# Altium footprint library Lay-51943_B.brd.PcbLib: 38 footprints (part 2 of 3)
Each footprint in its own frame and in the unit in brackets; x right, y up, seen from the top. Pads: shape width x height; smd on the part's side, far side on the other; paste and mask are expansions set on the pad; w line width, h text height; cw(c..) or ccw(c..) is an arc to the next point about the centre after c.
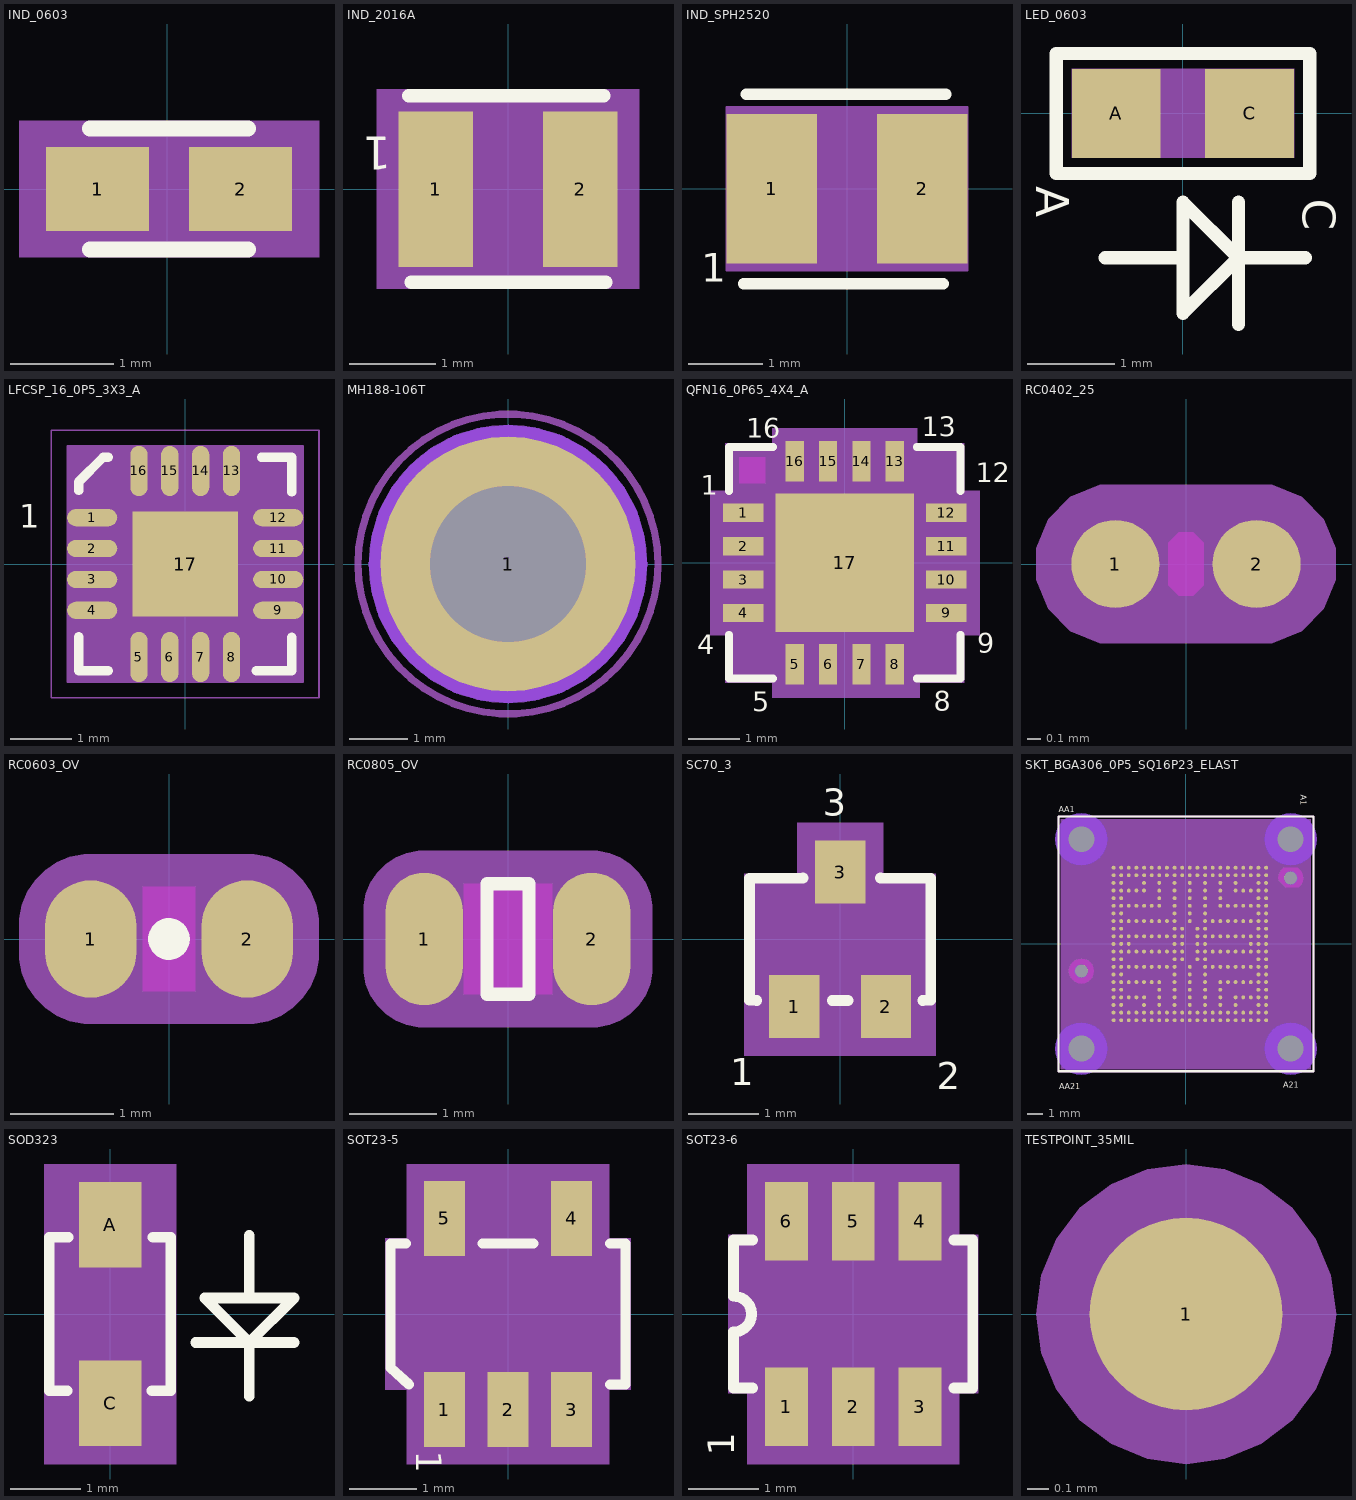
[diagram p1: the footprints below, top view; thin cyan lines are the x and y axes]

## IND_0603 [mil] "IND_0603"
pads (2):
  rect 39x32 smd: 1(-26.56,0) 2(27.78,0)
Top Overlay:
  lines w6: -29.39,-23 30.61,-23 ; -29.39,23 30.61,23
Top Courtyard:
  region: 57.61,-26 57.61,26 -56.39,26 -56.39,-26
Top Assembly:
  lines w1: -44.27,-14.96 30.53,-14.96 30.53,14.96 -29.31,14.96 -29.31,-14.96
Top Value:
  text ".Comment" at -51.17,-7.5 h15
Top Component Center:
  lines w1: -9.39,0 10.61,0 ; 0.61,-10 0.61,10
Top Designator:
  text ".Designator" at -54.7,-5.36 h15
Top Component Outline:
  region: -47.27,-17.96 47.28,-17.96 47.28,17.96 -47.27,17.96
  region: -47.27,-17.96 47.28,-17.96 47.28,17.96 -47.27,17.96
3D body "L_0603.stp": height 31.89, standoff 0.39, extent -30.89,-15.75 32.11,15.75

## IND_2016A [mil] "IND_2016A"
pads (2):
  rect 34x71 smd: 1(-32.87,-0.08) 2(32.87,-0.08)
Top Overlay:
  lines w5.98: -45.24,42.48 43.66,42.48 43.66,42.64 ; -44.29,-42.48 44.61,-42.48 44.61,-42.32
  text "1" at -53.3,23.81 h15
Top Courtyard:
  region: -59.87,-45.43 59.87,-45.43 59.87,45.43 -59.87,45.43
Top Assembly:
  lines w1: -43.31,-35.51 -43.31,35.35 43.31,35.35 43.31,-35.51 -43.31,-35.51
Top Value:
  text ".Comment" at -51.17,-7.5 h15
Top Component Center:
  lines w1: -10,-0.08 10,-0.08 ; 0,-10.08 0,9.92
Top Designator:
  text ".Designator" at -54.7,-5.36 h15
Top Component Outline:
  region: -49.87,-35.43 49.87,-35.43 49.87,35.43 -49.87,35.43
  region: -49.87,-35.43 -49.87,35.43 49.87,35.43 49.87,-35.43
3D body "INDC2012X95N EIA 0805.step": height 37.4, standoff 0, extent -39.37,-23.7 39.37,23.54

## IND_SPH2520 [mil] "IND_SPH2520"
pads (2):
  rect 48x79 smd: 1(-39.75,0) 2(39.75,0)
Top Overlay:
  lines w5.98: -54.65,-50.24 50.87,-50.24 ; -53.23,50 52.28,50
  text "1" at -77.1,-49.06 h15
Top Assembly:
  lines w1: -53.15,-43.31 -53.15,43.31 53.15,43.31 53.15,-43.31 -53.15,-43.31
Top Value:
  lines w1: -63.76,-43.31 63.76,-43.31 63.76,43.31 -63.76,43.31 -63.76,-43.31
  text ".Comment" at -51.17,-7.5 h15
Top Component Center:
  lines w1: -10,0 10,0 ; 0,-10 0,10
Top Designator:
  text ".Designator" at -54.7,-5.36 h15
Top Component Outline:
  region: 63.76,43.31 63.76,-43.31 -63.76,-43.31 -63.76,43.31
3D body "INDC2520X220N EIA 1008.step": height 86.61, standoff 0, extent -49.21,-39.37 49.21,39.37

## LED_0603 [mil] "LED_0603"
pads (2):
  rect 40x40 smd: A(-30,0) C(30,0)
Top Overlay:
  lines w6: -57,27 -57,-27 57,-27 57,27 -56.5,27 ; -35,-65 0,-65 ; 25,-95 25,-40 ; 55,-65 25,-65 ; 25,-65 0,-90 0,-40 25,-65
  text "C" at 53.87,-38.33 h15
  text "A" at -66.12,-32.84 h15
Top Assembly:
  lines w1: -35,-65 0,-65 ; 25,-95 25,-40 ; 55,-65 25,-65 ; 25,-65 0,-90 0,-40 25,-65 ; -33.46,-17.72 -33.46,17.72 33.46,17.72 33.46,-17.72 -33.46,-17.72
Top Value:
  text ".Comment" at -51.17,-7.5 h15
Top Component Center:
  lines w1: -10,0 10,0 ; 0,-10 0,10
Top Designator:
  text ".Designator" at -54.7,-5.36 h15
Top Component Outline:
  region: -50,-20 50,-20 50,20 -50,20
  region: -50,-20 50,-20 50,20 -50,20
3D body "LTST-C190GKT.STEP": height 35.43, standoff 0, extent -33.46,-17.72 33.46,17.72

## LFCSP_16_0P5_3X3_A [mil] "LFCSP_16_0P5_3X3_A"
pads (17):
  oval 32x11 smd: 1(-59.31,29.53) 2(-59.31,9.84) 3(-59.31,-9.84) 4(-59.31,-29.53) 9(59.31,-29.53) 10(59.31,-9.84) 11(59.31,9.84) 12(59.31,29.53)
  oval 11x32 smd: 5(-29.53,-59.31) 6(-9.84,-59.31) 7(9.84,-59.31) 8(29.53,-59.31) 13(29.53,59.31) 14(9.84,59.31) 15(-9.84,59.31) 16(-29.53,59.31)
  rect 67x67 smd paste-99999: 17(0,0)
Top Overlay:
  lines w6: -68.02,-46.48 -68.02,-68.02 -49.11,-68.02 ; -68.02,46.87 -68.02,52.28 -52.28,68.02 -49.12,68.02 ; 45.3,-68.02 68.02,-68.02 68.02,-46.82 ; 48.64,68.02 68.02,68.02 68.02,45.9
  text "1" at -106,23 h15
Top Paste:
  region: -3.5,3.5 -3.5,31.5 -28,31.5 -28,3.5
  region: 28,3.5 28,31.5 3.5,31.5 3.5,3.5
  region: 28,-31.5 28,-3.5 3.5,-3.5 3.5,-31.5
  region: -3.5,-31.5 -3.5,-3.5 -28,-3.5 -28,-31.5
Top Courtyard:
  lines w1: -85.31,-85.31 85.31,-85.31 85.31,85.31 -85.31,85.31 -85.31,-85.31
Top Assembly:
  lines w1: -61.02,-61.02 -61.02,45.28 -45.28,61.02 61.02,61.02 61.02,-61.02 -61.02,-61.02
Top Value:
  lines w1: -75.31,-75.31 75.31,-75.31 75.31,75.31 -75.31,75.31 -75.31,-75.31
  text ".Comment" at -51.17,-7.5 h15
Top Component Center:
  lines w1: -10,0 10,0 ; 0,-10 0,10
Top Designator:
  text ".Designator" at -54.7,-5.36 h15
Top Component Outline:
  region: -75.31,-75.31 75.31,-75.31 75.31,75.31 -75.31,75.31
3D body "QFN16 3x3.STEP": height 35.43, standoff 0, extent -61,-59.88 58.77,59.88

## MH188-106T [mil] "MH188-106T"
pads (1):
  round 173.23 / inner round 156 / far side round 173.23 hole 106: 1(0,0)
Bottom Layer keep-out:
  region: 94.45,0 92.64,18.43 87.26,36.15 78.54,52.48 66.79,66.79 52.48,78.54 36.15,87.26 18.43,92.64 0,94.45 -18.43,92.64 -36.15,87.26 -47.03,81.45 -52.48,78.54 -66.79,66.79 -78.54,52.48 -87.26,36.15 -92.64,18.43 -94.45,0 -92.64,-18.43 -87.26,-36.15 -78.54,-52.48 -66.79,-66.79 -52.48,-78.54 -47.03,-81.45 -36.15,-87.26 -18.43,-92.64 0,-94.45 18.43,-92.64 36.15,-87.26 52.48,-78.54 66.79,-66.79 78.54,-52.48 87.26,-36.15 92.64,-18.43
Top Courtyard:
  circle w5: c0,0 r101.83
Top Assembly:
  circle w0.01: c0,0 r94
Top Value:
  text ".Comment" at -51.17,-7.5 h15
Top Component Center:
  lines w1: -10,0 10,0 ; 0,-10 0,10
Top Designator:
  text ".Designator" at -54.7,-5.36 h15
Top Component Outline:
  circle w5: c0,0 r92
  region: 94.45,0 92.64,18.43 87.26,36.15 78.54,52.48 66.79,66.79 52.48,78.54 36.15,87.26 18.43,92.64 0,94.45 -18.43,92.64 -36.15,87.26 -47.03,81.45 -52.48,78.54 -66.79,66.79 -78.54,52.48 -87.26,36.15 -92.64,18.43 -94.45,0 -92.64,-18.43 -87.26,-36.15 -78.54,-52.48 -66.79,-66.79 -52.48,-78.54 -47.03,-81.45 -36.15,-87.26 -18.43,-92.64 0,-94.45 18.43,-92.64 36.15,-87.26 52.48,-78.54 66.79,-66.79 78.54,-52.48 87.26,-36.15 92.64,-18.43

## QFN16_0P65_4X4_A [mil] "QFN16_0P65_4X4_A"
pads (17):
  rect 31x14 smd paste+0: 1(-77.76,38.38) 2(-77.76,12.79) 3(-77.76,-12.81) 4(-77.76,-38.4) 9(77.76,-38.4) 10(77.76,-12.81) 11(77.76,12.79) 12(77.76,38.38)
  rect 14x31 smd paste+0: 5(-38.39,-77.77) 6(-12.8,-77.77) 7(12.8,-77.77) 8(38.39,-77.77) 13(38.39,77.75) 14(12.8,77.75) 15(-12.8,77.75) 16(-38.39,77.75)
  rect 106x106 smd paste-99999: 17(0,-0.01)
Top Layer keep-out:
  region: -80.82,61.12 -80.82,80.81 -61.13,80.81 -61.13,61.12
  region: -80.82,61.12 -61.13,61.12 -61.13,80.81 -80.82,80.81
Top Overlay:
  lines w6: -88.69,-55.13 -88.69,-88.7 -55.12,-88.7 ; -88.69,55.11 -88.69,88.68 -55.12,88.68 ; 55.12,-88.7 88.69,-88.7 88.69,-55.13 ; 55.12,88.68 88.69,88.68 88.69,55.11
  text "1" at -110.2,52.23 h15
  text "4" at -113.24,-69.92 h15
  text "5" at -70.73,-113.82 h15
  text "8" at 68.24,-113.36 h15
  text "9" at 101.64,-68.98 h15
  text "12" at 100.24,61.81 h15
  text "13" at 59.13,97.08 h15
  text "16" at -75.4,95.68 h15
Top Paste:
  region: 7.78,7.77 7.78,45.35 45.36,45.35 45.36,7.77
  region: 7.78,-45.37 7.78,-7.79 45.36,-7.79 45.36,-45.37
  region: -45.36,7.77 -45.36,45.35 -7.78,45.35 -7.78,7.77
  region: -45.36,-45.37 -45.36,-7.79 -7.78,-7.79 -7.78,-45.37
Top Courtyard:
  region: -55.39,-91.71 -91.7,-91.71 -91.7,-55.4 -103.26,-55.4 -103.26,55.36 -91.7,55.36 -91.7,91.67 -55.39,91.67 -55.39,103.25 55.38,103.25 55.38,91.67 91.69,91.67 91.69,55.36 103.25,55.36 103.25,-55.4 91.69,-55.4 91.69,-91.71 57.38,-91.71 57.38,-103.28 -55.39,-103.28
Top Assembly:
  lines w1: -81.69,-81.7 81.69,-81.7 81.69,81.68 -81.69,81.68 -81.69,-81.7
  text "16" at -46.39,72.75 h10
  text "13" at 30.39,72.75 h10
  text "12" at 69.76,33.38 h10
  text "9" at 73.76,-43.4 h10
  text "8" at 34.39,-82.77 h10
  text "5" at -42.39,-82.77 h10
  text "4" at -81.76,-43.4 h10
  text "1" at -81.76,33.38 h10
Top Value:
  text ".Comment" at -51.17,-7.5 h15
Top Component Center:
  lines w1: -10,-0.01 10,-0.01 ; 0,-10.01 0,9.99
Top Designator:
  text ".Designator" at -54.7,-5.36 h15
Top Component Outline:
  region: -45.39,-93.27 -45.39,-81.7 -81.69,-81.7 -81.69,-45.39 -93.25,-45.39 -93.25,45.37 -81.69,45.37 -81.69,81.68 -45.39,81.68 -45.39,93.27 45.39,93.27 45.39,81.68 81.69,81.68 81.69,45.38 93.26,45.38 93.26,-45.39 81.69,-45.39 81.69,-81.7 47.39,-81.7 47.39,-93.27
  region: -45.39,-93.27 -45.39,-81.7 -81.69,-81.7 -81.69,-45.39 -93.25,-45.39 -93.25,45.37 -81.69,45.37 -81.69,81.68 -45.39,81.68 -45.39,93.27 45.39,93.27 45.39,81.68 81.69,81.68 81.69,45.38 93.26,45.38 93.26,-45.39 81.69,-45.39 81.69,-81.7 47.39,-81.7 47.39,-93.27
3D body "QFN16 4x4.step": height 36.22, standoff 0, extent -78.74,-78.74 78.74,78.74

## RC0402_25 [mil] "RC0402_25"
pads (2):
  round 25 smd: 1(-20,0) 2(20,0)
Top Layer keep-out:
  region: 5,4 5,-4 5,-6.07 2.07,-9 -2.07,-9 -5,-6.07 -5,-4 -5,4 -5,6.07 -2.07,9 2.07,9 5,6.07
Top Courtyard:
  region: -20,-22.5 -24.48,-22.5 -32.75,-19.07 -39.07,-12.75 -42.5,-4.48 -42.5,4.48 -39.07,12.75 -32.75,19.07 -24.48,22.5 -20,22.5 20,22.5 24.48,22.5 32.75,19.07 39.07,12.75 42.5,4.48 42.5,-4.48 39.07,-12.75 32.75,-19.07 24.48,-22.5 20,-22.5
Top Assembly:
  lines w1: -20,-10 -20,10 20,10 20,-10 -20,-10
Top Value:
  text ".Comment" at -51.17,-7.5 h15
Top Component Center:
  lines w1: -10,0 10,0 ; 0,-10 0,10
Top Designator:
  text ".Designator" at -54.7,-5.36 h15
Top Component Outline:
  region: 20,-12.5 22.49,-12.5 27.08,-10.6 30.6,-7.08 32.5,-2.49 32.5,2.49 30.6,7.08 27.08,10.6 22.49,12.5 20,12.5 -20,12.5 -22.49,12.5 -27.08,10.6 -30.6,7.08 -32.5,2.49 -32.5,-2.49 -30.6,-7.08 -27.08,-10.6 -22.49,-12.5 -20,-12.5
  region: 20,-12.5 22.49,-12.5 27.08,-10.6 30.6,-7.08 32.5,-2.49 32.5,2.49 30.6,7.08 27.08,10.6 22.49,12.5 20,12.5 -20,12.5 -22.49,12.5 -27.08,10.6 -30.6,7.08 -32.5,2.49 -32.5,-2.49 -30.6,-7.08 -27.08,-10.6 -22.49,-12.5 -20,-12.5
3D body "RES_1005-0402.step": height 16.14, standoff 0, extent -22.64,-10.83 22.64,10.83

## RC0603_OV [mil] "RC0603_OV"
pads (2):
  oval 35x45 smd: 1(-30,0) 2(30,0)
Top Layer keep-out:
  region: -10,20 10,20 10,-20 -10,-20
Top Overlay:
  circle w6: c0,0 r5
  dashed: 0,3.03 -2.11,2.15 -2.99,0.04 -2.41,-1.35 -2.11,-2.07 0,-2.95 2.11,-2.07 2.41,-1.35 2.99,0.04 2.11,2.15
Top Courtyard:
  region: -30,-32.5 -32.71,-32.5 -38.02,-31.44 -43.03,-29.37 -47.53,-26.36 -51.36,-22.53 -54.37,-18.03 -56.44,-13.02 -57.5,-7.71 -57.5,-5 -57.5,5 -57.5,7.71 -56.44,13.02 -54.37,18.03 -51.36,22.53 -47.53,26.36 -43.03,29.37 -38.02,31.44 -32.71,32.5 -30,32.5 30,32.5 32.71,32.5 38.02,31.44 43.03,29.37 47.53,26.36 51.36,22.53 54.37,18.03 56.44,13.02 57.5,7.71 57.5,5 57.5,-5 57.5,-7.71 56.44,-13.02 54.37,-18.03 51.36,-22.53 47.53,-26.36 43.03,-29.37 38.02,-31.44 32.71,-32.5 30,-32.5
Top Assembly:
  lines w1: -30,-15 -30,15 30,15 30,-15 -30,-15
Top Value:
  text ".Comment" at -51.17,-7.5 h15
Top Component Center:
  lines w1: -10,0 10,0 ; 0,-10 0,10
Top Designator:
  text ".Designator" at -54.7,-5.36 h15
Top Component Outline:
  region: -30,22.5 30,22.5 33.48,22.5 39.91,19.84 44.84,14.91 47.5,8.48 47.5,5 47.5,-5 47.5,-8.48 44.84,-14.91 39.91,-19.84 33.48,-22.5 30,-22.5 -30,-22.5 -33.48,-22.5 -39.91,-19.84 -44.84,-14.91 -47.5,-8.48 -47.5,-5 -47.5,5 -47.5,8.48 -44.84,14.91 -39.91,19.84 -33.48,22.5
  region: -30,22.5 30,22.5 33.48,22.5 39.91,19.84 44.84,14.91 47.5,8.48 47.5,5 47.5,-5 47.5,-8.48 44.84,-14.91 39.91,-19.84 33.48,-22.5 30,-22.5 -30,-22.5 -33.48,-22.5 -39.91,-19.84 -44.84,-14.91 -47.5,-8.48 -47.5,-5 -47.5,5 -47.5,8.48 -44.84,14.91 -39.91,19.84 -33.48,22.5
3D body "RES_1609-0603.step": height 22.05, standoff 0, extent -33.46,-15.75 33.46,15.75

## RC0805_OV [mil] "RC0805_OV"
pads (2):
  oval 35x60 smd: 1(-38,0) 2(38,0)
Top Layer keep-out:
  region: -20,25 20,25 20,-25 -20,-25
Top Overlay:
  lines w6: -9.5,-25 -9.5,25 9.5,25 9.5,-25 -9.5,-25
Top Courtyard:
  region: -38,-40 -40.71,-40 -46.02,-38.94 -51.03,-36.87 -55.53,-33.86 -59.36,-30.03 -62.37,-25.53 -64.44,-20.52 -65.5,-15.21 -65.5,-12.5 -65.5,12.5 -65.5,15.21 -64.44,20.52 -62.37,25.53 -59.36,30.03 -55.53,33.86 -51.03,36.87 -46.02,38.94 -40.71,40 -38,40 38,40 40.71,40 46.02,38.94 51.03,36.87 55.53,33.86 59.36,30.03 62.37,25.53 64.44,20.52 65.5,15.21 65.5,12.5 65.5,-12.5 65.5,-15.21 64.44,-20.52 62.37,-25.53 59.36,-30.03 55.53,-33.86 51.03,-36.87 46.02,-38.94 40.71,-40 38,-40
Top Assembly:
  lines w1: -40,-25 -40,25 40,25 40,-25 -40,-25
Top Value:
  text ".Comment" at -51.17,-7.5 h15
Top Component Center:
  lines w1: -10,0 10,0 ; 0,-10 0,10
Top Designator:
  text ".Designator" at -54.7,-5.36 h15
Top Component Outline:
  region: -38,-30 38,-30 41.48,-30 47.91,-27.34 52.84,-22.41 55.5,-15.98 55.5,-12.5 55.5,12.5 55.5,15.98 52.84,22.41 47.91,27.34 41.48,30 38,30 -38,30 -41.48,30 -47.91,27.34 -52.84,22.41 -55.5,15.98 -55.5,12.5 -55.5,-12.5 -55.5,-15.98 -52.84,-22.41 -47.91,-27.34 -41.48,-30
  region: -38,-30 38,-30 41.48,-30 47.91,-27.34 52.84,-22.41 55.5,-15.98 55.5,-12.5 55.5,12.5 55.5,15.98 52.84,22.41 47.91,27.34 41.48,30 38,30 -38,30 -41.48,30 -47.91,27.34 -52.84,22.41 -55.5,15.98 -55.5,12.5 -55.5,-12.5 -55.5,-15.98 -52.84,-22.41 -47.91,-27.34 -41.48,-30
3D body "RES_2013-0805.step": height 29.92, standoff 0, extent -45.28,-26.57 45.28,26.57

## SC70_3 [mil] "SC70_3"
pads (3):
  rect 28x35 smd: 1(-25.5,-37.47) 2(25.5,-37.47) 3(0,37.47)
Top Overlay:
  lines w6: -46.42,-34.06 -50.5,-34 -50.5,34 -20.67,34.06 ; -4.37,-34.06 4.33,-34.06 ; 22.48,34.06 50.5,34 50.5,-34 45.98,-34.06
  text "1" at -61.22,-81.38 h15
  text "2" at 53.89,-83.37 h15
  text "3" at -9.69,68.7 h15
Top Courtyard:
  region: -53.3,36.61 -24,36.61 -24,64.97 24,64.97 24,36.61 53.3,36.61 53.3,-64.97 -53.3,-64.97
Top Assembly:
  lines w1: -5,0 5,0 ; 0,-5 0,5 ; -43.3,-26.61 43.3,-26.61 43.3,26.61 -43.3,26.61 -43.3,-26.61
Top Value:
  text ".Comment" at -51.17,-7.5 h15
Top Component Center:
  lines w1: -10,0 10,0 ; 0,-10 0,10
Top Designator:
  text ".Designator" at -54.7,-5.36 h15
Top Component Outline:
  region: -43.3,-54.97 43.3,-54.97 43.3,26.61 14,26.61 14,54.97 -14,54.97 -14,26.61 -43.3,26.61
  region: -43.3,-54.97 43.3,-54.97 43.3,26.61 14,26.61 14,54.97 -14,54.97 -14,26.61 -43.3,26.61
3D body "SOT323_sc70-3.step": height 39.37, standoff 0, extent -41.34,-45.28 41.34,45.28

## SKT_BGA306_0P5_SQ16P23_ELAST [mil] "SKT_BGA306_0P5_SQ16P23_ELAST"
pads (312):
  round 10 smd: A1(206.69,196.85) A2(206.69,177.17) A3(206.69,157.48) A4(206.69,137.8) A5(206.69,118.11) A6(206.69,98.43) A7(206.69,78.74) A8(206.69,59.06) A9(206.69,39.37) A10(206.69,19.69) A11(206.69,0) A12(206.69,-19.69) A13(206.69,-39.37) A14(206.69,-59.06) A15(206.69,-78.74) A16(206.69,-98.43) A17(206.69,-118.11) A18(206.69,-137.8) A19(206.69,-157.48) A20(206.69,-177.17) A21(206.69,-196.85) AA1(-187.01,196.85) AA2(-187.01,177.17) AA3(-187.01,157.48) AA4(-187.01,137.8) AA5(-187.01,118.11) AA6(-187.01,98.43) AA7(-187.01,78.74) AA8(-187.01,59.06) AA9(-187.01,39.37) AA10(-187.01,19.69) AA11(-187.01,0) AA12(-187.01,-19.69) AA13(-187.01,-39.37) AA14(-187.01,-59.06) AA15(-187.01,-78.74) AA16(-187.01,-98.43) AA17(-187.01,-118.11) AA18(-187.01,-137.8) AA19(-187.01,-157.48) AA20(-187.01,-177.17) AA21(-187.01,-196.85) B1(187.01,196.85) B2(187.01,177.17) B3(187.01,157.48) B4(187.01,137.8) B5(187.01,118.11) B6(187.01,98.43) B7(187.01,78.74) B8(187.01,59.06) B9(187.01,39.37) B10(187.01,19.69) B11(187.01,0) B12(187.01,-19.69) B13(187.01,-39.37) B14(187.01,-59.06) B15(187.01,-78.74) B16(187.01,-98.43) B17(187.01,-118.11) B18(187.01,-137.8) B19(187.01,-157.48) B20(187.01,-177.17) B21(187.01,-196.85) C1(167.32,196.85) C2(167.32,177.17) C4(167.32,137.8) C6(167.32,98.43) C8(167.32,59.06) C10(167.32,19.69) C11(167.32,0) C12(167.32,-19.69) C14(167.32,-59.06) C16(167.32,-98.43) C18(167.32,-137.8) C20(167.32,-177.17) C21(167.32,-196.85) D1(147.64,196.85) D2(147.64,177.17) D4(147.64,137.8) D6(147.64,98.43) D8(147.64,59.06) D10(147.64,19.69) D12(147.64,-19.69) D14(147.64,-59.06) D16(147.64,-98.43) D18(147.64,-137.8) D20(147.64,-177.17) D21(147.64,-196.85) E1(127.95,196.85) E2(127.95,177.17) E3(127.95,157.48) E4(127.95,137.8) E6(127.95,98.43) E8(127.95,59.06) E10(127.95,19.69) E12(127.95,-19.69) E14(127.95,-59.06) E16(127.95,-98.43) E18(127.95,-137.8) E19(127.95,-157.48) E20(127.95,-177.17) E21(127.95,-196.85) F1(108.27,196.85) F2(108.27,177.17) F6(108.27,98.43) F8(108.27,59.06) F10(108.27,19.69) F12(108.27,-19.69) F14(108.27,-59.06) F16(108.27,-98.43) F20(108.27,-177.17) F21(108.27,-196.85) G1(88.58,196.85) G2(88.58,177.17) G3(88.58,157.48) G4(88.58,137.8) G5(88.58,118.11) G6(88.58,98.43) G8(88.58,59.06) G10(88.58,19.69) G12(88.58,-19.69) G14(88.58,-59.06) G16(88.58,-98.43) G17(88.58,-118.11) G18(88.58,-137.8) G19(88.58,-157.48) G20(88.58,-177.17) G21(88.58,-196.85) H1(68.9,196.85) H2(68.9,177.17) H8(68.9,59.06) H10(68.9,19.69) H12(68.9,-19.69) H14(68.9,-59.06) H20(68.9,-177.17) H21(68.9,-196.85) J1(49.21,196.85) J2(49.21,177.17) J3(49.21,157.48) J4(49.21,137.8) J5(49.21,118.11) J6(49.21,98.43) J7(49.21,78.74) J8(49.21,59.06) J9(49.21,39.37) J10(49.21,19.69) J11(49.21,0) J12(49.21,-19.69) J13(49.21,-39.37) J14(49.21,-59.06) J15(49.21,-78.74) J16(49.21,-98.43) J17(49.21,-118.11) J18(49.21,-137.8) J19(49.21,-157.48) J20(49.21,-177.17) J21(49.21,-196.85) K1(29.53,196.85) K2(29.53,177.17) K9(29.53,39.37) K10(29.53,19.69) K11(29.53,0) K12(29.53,-19.69) K13(29.53,-39.37) K20(29.53,-177.17) K21(29.53,-196.85) L1(9.84,196.85) L2(9.84,177.17) L3(9.84,157.48) L4(9.84,137.8) L5(9.84,118.11) L6(9.84,98.43) L7(9.84,78.74) L8(9.84,59.06) L14(9.84,-59.06) L15(9.84,-78.74) L16(9.84,-98.43) L17(9.84,-118.11) L18(9.84,-137.8) L19(9.84,-157.48) L20(9.84,-177.17) L21(9.84,-196.85) M1(-9.84,196.85) M2(-9.84,177.17) M9(-9.84,39.37) M10(-9.84,19.69) M11(-9.84,0) M12(-9.84,-19.69) M13(-9.84,-39.37) M20(-9.84,-177.17) M21(-9.84,-196.85) N1(-29.53,196.85) N2(-29.53,177.17) N3(-29.53,157.48) N4(-29.53,137.8) N5(-29.53,118.11) N6(-29.53,98.43) N7(-29.53,78.74) N8(-29.53,59.06) N9(-29.53,39.37) N10(-29.53,19.69) N11(-29.53,0) N12(-29.53,-19.69) N13(-29.53,-39.37) N14(-29.53,-59.06) N15(-29.53,-78.74) N16(-29.53,-98.43) N17(-29.53,-118.11) N18(-29.53,-137.8) N19(-29.53,-157.48) N20(-29.53,-177.17) N21(-29.53,-196.85) P1(-49.21,196.85) P2(-49.21,177.17) P8(-49.21,59.06) P10(-49.21,19.69) P12(-49.21,-19.69) P14(-49.21,-59.06) P20(-49.21,-177.17) P21(-49.21,-196.85) R1(-68.9,196.85) R2(-68.9,177.17) R3(-68.9,157.48) R4(-68.9,137.8) R5(-68.9,118.11) R6(-68.9,98.43) R8(-68.9,59.06) R10(-68.9,19.69) R12(-68.9,-19.69) R14(-68.9,-59.06) R16(-68.9,-98.43) R17(-68.9,-118.11) R18(-68.9,-137.8) R19(-68.9,-157.48) R20(-68.9,-177.17) R21(-68.9,-196.85) T1(-88.58,196.85) T2(-88.58,177.17) T6(-88.58,98.43) T8(-88.58,59.06) T10(-88.58,19.69) T12(-88.58,-19.69) T14(-88.58,-59.06) T16(-88.58,-98.43) T20(-88.58,-177.17) T21(-88.58,-196.85) U1(-108.27,196.85) U2(-108.27,177.17) U3(-108.27,157.48) U4(-108.27,137.8) U6(-108.27,98.43) U8(-108.27,59.06) U10(-108.27,19.69) U12(-108.27,-19.69) U14(-108.27,-59.06) U16(-108.27,-98.43) U18(-108.27,-137.8) U19(-108.27,-157.48) U20(-108.27,-177.17) U21(-108.27,-196.85) V1(-127.95,196.85) V2(-127.95,177.17) V4(-127.95,137.8) V6(-127.95,98.43) V8(-127.95,59.06) V10(-127.95,19.69) V12(-127.95,-19.69) V14(-127.95,-59.06) V16(-127.95,-98.43) V18(-127.95,-137.8) V20(-127.95,-177.17) V21(-127.95,-196.85) W1(-147.64,196.85) W2(-147.64,177.17) W4(-147.64,137.8) W6(-147.64,98.43) W8(-147.64,59.06) W10(-147.64,19.69) W11(-147.64,0) W12(-147.64,-19.69) W14(-147.64,-59.06) W16(-147.64,-98.43) W18(-147.64,-137.8) W20(-147.64,-177.17) W21(-147.64,-196.85) Y1(-167.32,196.85) Y2(-167.32,177.17) Y3(-167.32,157.48) Y4(-167.32,137.8) Y5(-167.32,118.11) Y6(-167.32,98.43) Y7(-167.32,78.74) Y8(-167.32,59.06) Y9(-167.32,39.37) Y10(-167.32,19.69) Y11(-167.32,0) Y12(-167.32,-19.69) Y13(-167.32,-39.37) Y14(-167.32,-59.06) Y15(-167.32,-78.74) Y16(-167.32,-98.43) Y17(-167.32,-118.11) Y18(-167.32,-137.8) Y19(-167.32,-157.48) Y20(-167.32,-177.17) Y21(-167.32,-196.85)
  round 0 hole 66.9 unplated: ""(-270.18,-270.2) ""(-270.18,270.2) ""(270.18,-270.2) ""(270.18,270.2)
  round 0 hole 33.4 unplated: ""(-270.18,-70.18) ""(270.18,170.18)
Bottom Layer keep-out:
  region: 270.18,153.11 276.71,154.41 282.24,158.11 285.94,163.65 287.24,170.18 285.94,176.71 284.7,178.56 282.24,182.24 276.71,185.94 270.18,187.24 263.65,185.94 258.11,182.24 255.65,178.56 254.41,176.71 253.11,170.18 254.41,163.65 258.11,158.11 263.65,154.41
  region: -270.18,-87.24 -263.65,-85.94 -258.11,-82.24 -254.42,-76.71 -253.12,-70.18 -254.42,-63.65 -255.66,-61.79 -258.11,-58.11 -263.65,-54.42 -270.18,-53.12 -276.71,-54.42 -282.24,-58.11 -284.7,-61.79 -285.94,-63.65 -287.24,-70.18 -285.94,-76.71 -282.24,-82.24 -276.71,-85.94
  region: -270.18,-303.95 -261.44,-302.8 -253.3,-299.43 -246.31,-294.06 -240.95,-287.07 -237.58,-278.93 -236.43,-270.2 -237.58,-261.46 -240.95,-253.32 -246.31,-246.33 -253.3,-240.97 -261.44,-237.59 -270.18,-236.44 -278.91,-237.59 -287.05,-240.97 -294.04,-246.33 -299.41,-253.32 -302.78,-261.46 -303.93,-270.2 -302.78,-278.93 -299.41,-287.07 -294.04,-294.06 -287.05,-299.43 -278.91,-302.8
  region: -270.18,-337.44 -257.06,-336.15 -244.44,-332.32 -232.82,-326.11 -222.63,-317.75 -214.26,-307.56 -208.05,-295.93 -204.22,-283.32 -202.93,-270.2 -204.22,-257.08 -208.05,-244.46 -212.19,-236.72 -214.26,-232.84 -222.63,-222.65 -232.82,-214.28 -244.44,-208.07 -257.06,-204.24 -270.18,-202.95 -283.3,-204.24 -295.91,-208.07 -307.54,-214.28 -317.73,-222.65 -326.09,-232.84 -328.17,-236.72 -332.31,-244.46 -336.13,-257.08 -337.42,-270.2 -336.13,-283.32 -332.31,-295.93 -326.09,-307.56 -317.73,-317.75 -307.54,-326.11 -295.91,-332.32 -283.3,-336.15
  region: 270.18,-303.95 278.91,-302.8 287.05,-299.43 294.04,-294.06 299.41,-287.07 302.78,-278.93 303.93,-270.2 302.78,-261.46 299.41,-253.32 294.04,-246.33 287.05,-240.97 278.91,-237.59 270.18,-236.44 261.44,-237.59 253.3,-240.97 246.31,-246.33 240.95,-253.32 237.58,-261.46 236.43,-270.2 237.58,-278.93 240.95,-287.07 246.31,-294.06 253.3,-299.43 261.44,-302.8
  region: 270.18,-337.45 283.3,-336.16 295.92,-332.33 307.54,-326.12 317.74,-317.75 326.1,-307.56 332.31,-295.94 336.14,-283.32 337.43,-270.2 336.14,-257.08 332.31,-244.46 328.17,-236.71 326.1,-232.83 317.74,-222.64 307.54,-214.27 295.92,-208.06 283.3,-204.23 270.18,-202.94 257.06,-204.23 244.44,-208.06 232.81,-214.27 222.62,-222.64 214.25,-232.83 212.18,-236.71 208.04,-244.46 204.21,-257.08 202.92,-270.2 204.21,-283.32 208.04,-295.94 214.25,-307.56 222.62,-317.75 232.81,-326.12 244.44,-332.33 257.06,-336.16
  region: 270.18,236.44 278.91,237.59 287.06,240.96 294.05,246.33 299.41,253.32 302.78,261.46 303.93,270.2 302.78,278.93 299.41,287.07 294.05,294.07 287.06,299.43 278.91,302.8 270.18,303.95 261.44,302.8 253.3,299.43 246.31,294.07 240.94,287.07 237.57,278.93 236.42,270.2 237.57,261.46 240.94,253.32 246.31,246.33 253.3,240.96 261.44,237.59
  region: 270.18,202.94 283.3,204.23 295.92,208.06 307.55,214.27 317.74,222.64 326.1,232.83 332.32,244.46 336.15,257.07 337.44,270.2 336.15,283.32 332.32,295.94 328.18,303.68 326.1,307.56 317.74,317.76 307.55,326.12 295.92,332.34 283.3,336.17 270.18,337.46 257.06,336.17 244.44,332.34 232.81,326.12 222.62,317.76 214.25,307.56 212.18,303.68 208.04,295.94 204.21,283.32 202.92,270.2 204.21,257.07 208.04,244.46 214.25,232.83 222.62,222.64 232.81,214.27 244.44,208.06 257.06,204.23
  region: -270.18,202.95 -257.06,204.24 -244.44,208.07 -232.81,214.28 -222.62,222.64 -214.26,232.83 -208.05,244.46 -204.22,257.08 -202.93,270.2 -204.22,283.32 -208.05,295.93 -212.19,303.68 -214.26,307.56 -222.62,317.75 -232.81,326.11 -244.44,332.33 -257.06,336.16 -270.18,337.45 -283.3,336.16 -295.91,332.33 -307.54,326.11 -317.73,317.75 -326.09,307.56 -328.17,303.68 -332.31,295.93 -336.14,283.32 -337.43,270.2 -336.14,257.08 -332.31,244.46 -326.09,232.83 -317.73,222.64 -307.54,214.28 -295.91,208.07 -283.3,204.24
  region: -270.18,236.44 -261.44,237.59 -253.3,240.96 -246.31,246.33 -240.94,253.32 -237.57,261.46 -236.42,270.2 -237.57,278.93 -240.94,287.07 -246.31,294.07 -253.3,299.43 -261.44,302.8 -270.18,303.95 -278.91,302.8 -287.06,299.43 -294.05,294.07 -299.41,287.07 -302.78,278.93 -303.93,270.2 -302.78,261.46 -299.41,253.32 -294.05,246.33 -287.06,240.96 -278.91,237.59
Top Overlay:
  lines w6: -328.95,-328.95 328.95,-328.95 328.95,328.95 -328.95,328.95 -328.95,-328.95
  text "AA21" at -327.69,-374.39 h15
  text "A1" at 296.16,384.92 h15
  text "AA1" at -328.76,340.5 h15
  text "A21" at 251.46,-370.93 h15
Keep-Out Layer:
  region: 291.31,146.5 294.02,148.92 298.21,154.85 300.94,161.58 302.09,168.75 301.59,176 299.46,182.94 295.82,189.23 290.86,194.53 287.84,196.55 252.52,196.55 248.67,193.97 242.77,186.84 239.16,178.32 238.12,169.13 238.94,164.57 257.01,146.5
  region: 295,228.57 300.45,231.82 309.31,240.91 315.53,251.97 318.69,264.26 318.59,276.95 315.21,289.19 308.81,300.14 299.79,309.08 288.78,315.4 276.52,318.66 263.83,318.66 251.57,315.4 240.56,309.08 231.54,300.14 225.14,289.19 221.76,276.95 221.66,264.26 224.82,251.97 231.04,240.91 239.9,231.82 245.35,228.57
  region: -270.18,221.31 -257.52,222.98 -245.73,227.86 -235.61,235.63 -227.84,245.75 -222.96,257.54 -221.29,270.2 -222.96,282.85 -227.84,294.64 -235.61,304.76 -245.73,312.53 -257.52,317.42 -270.18,319.08 -282.83,317.42 -294.62,312.53 -304.74,304.76 -312.51,294.64 -317.4,282.85 -319.06,270.2 -317.4,257.54 -312.51,245.75 -304.74,235.63 -294.62,227.86 -282.83,222.98
  region: -270.18,-102.18 -261.89,-101.09 -254.17,-97.9 -247.55,-92.81 -242.46,-86.18 -239.26,-78.46 -238.17,-70.18 -239.26,-61.89 -242.46,-54.17 -247.55,-47.55 -254.17,-42.46 -261.89,-39.26 -270.18,-38.17 -278.46,-39.26 -286.18,-42.46 -292.81,-47.55 -297.9,-54.17 -301.09,-61.89 -302.18,-70.18 -301.09,-78.46 -297.9,-86.18 -292.81,-92.81 -286.18,-97.9 -278.46,-101.09
  region: -270.18,-319.08 -257.53,-317.41 -245.74,-312.53 -235.61,-304.76 -227.84,-294.64 -222.96,-282.85 -221.3,-270.2 -222.96,-257.55 -227.84,-245.76 -235.61,-235.63 -245.74,-227.86 -257.53,-222.98 -270.18,-221.32 -282.83,-222.98 -294.62,-227.86 -304.74,-235.63 -312.51,-245.76 -317.39,-257.55 -319.06,-270.2 -317.39,-282.85 -312.51,-294.64 -304.74,-304.76 -294.62,-312.53 -282.83,-317.41
  region: 270.18,-319.08 282.83,-317.41 294.62,-312.53 304.74,-304.76 312.51,-294.64 317.39,-282.85 319.06,-270.2 317.39,-257.55 312.51,-245.76 304.74,-235.63 294.62,-227.86 282.83,-222.98 270.18,-221.32 257.53,-222.98 245.74,-227.86 235.61,-235.63 227.84,-245.76 222.96,-257.55 221.3,-270.2 222.96,-282.85 227.84,-294.64 235.61,-304.76 245.74,-312.53 257.53,-317.41
Top Courtyard:
  lines w6: -328.95,-328.95 328.95,-328.95 328.95,328.95 -328.95,328.95 -328.95,-328.95
Top Assembly:
  lines w1: -321.95,-321.95 321.95,-321.95 321.95,321.95 -321.95,321.95 -321.95,-321.95
Top Value:
  text ".Comment" at -51.17,-7.5 h15
Top Component Center:
  lines w1: -10,0 10,0 -10,0 ; 0,-10 0,10 0,-10
Top Designator:
  text ".Designator" at -54.7,-5.36 h15
Top Component Outline:
  region: -321.85,321.85 321.85,321.85 321.85,-321.85 -321.85,-321.85
  region: -321.85,-321.85 321.85,-321.85 321.85,321.85 -321.85,321.85
3D body "MIMX9352CVVXMAB.stp": height 48.03, standoff 0, extent -206.69,-216.53 226.38,216.54

## SOD323 [mil] "SOD323"
pads (2):
  rect 35x48 smd: A(0,50) C(0,-50)
Top Overlay:
  lines w6: -24,-43 -34,-43 -34,43 -23.5,43 ; 23.5,-43 34,-43 34,43 24,43 ; 48,-16 103,-16 ; 78,-46 78,-16 ; 78,9 78,44 ; 78,-16 53,9 103,9 78,-16
Top Courtyard:
  region: -37,-84 37,-84 37,84 -37,84
Top Assembly:
  lines w1: -25,-20 25,-20 ; 48,-16 103,-16 ; 78,-46 78,-16 ; 78,9 78,44 ; 78,-16 53,9 103,9 78,-16 ; -27,-36 -27,36 27,36 27,-36 -27,-36
Top Value:
  text ".Comment" at -7.5,51.17 h15
Top Component Center:
  lines w1: -10,0 10,0 ; 0,-10 0,10
Top Designator:
  text ".Designator" at -5.36,54.7 h15
Top Component Outline:
  region: 27,74 27,-74 -27,-74 -27,74
  region: -27,-74 -27,74 27,74 27,-74
3D body "SOD323.step": height 43.31, standoff 0, extent -26.57,-51.18 26.57,51.18

## SOT23-5 [mil] "SOT23-5"
pads (5):
  rect 24x44 smd: 1(-37.4,-56.1) 2(0,-56.1) 3(37.4,-56.1) 4(37.4,56.1) 5(-37.4,56.1)
Top Overlay:
  lines w6: -60,41.46 -69,41.46 -69,-31.61 -58.18,-41.46 ; -15,41.46 15,41.46 ; 60,-41.46 69,-41.46 69,41.46 60,41.46
  text "1" at -53.94,-80.21 h15
Top Courtyard:
  region: 59.4,-88.1 -59.4,-88.1 -59.4,-44.46 -72,-44.46 -72,44.46 -59.4,44.46 -59.4,88.1 59.4,88.1 59.4,44.46 72,44.46 72,-44.46 59.4,-44.46
Top Assembly:
  lines w1: -62,-24.61 -62,34.46 62,34.46 62,-34.46 -51.18,-34.46 -62,-24.61
Top Value:
  text ".Comment" at -51.17,-7.5 h15
Top Component Center:
  lines w1: -10,0 10,0 ; 0,-10 0,10
Top Designator:
  text ".Designator" at -54.7,-5.36 h15
Top Component Outline:
  region: -49.4,-78.1 -49.4,-34.46 -62,-34.46 -62,34.46 -49.4,34.46 -49.4,78.1 49.4,78.1 49.4,34.46 62,34.46 62,-34.46 49.4,-34.46 49.4,-78.1
  region: -49.4,-78.1 -49.4,-34.46 -62,-34.46 -62,34.46 -49.4,34.46 -49.4,78.1 49.4,78.1 49.4,34.46 62,34.46 62,-34.46 49.4,-34.46 49.4,-78.1
3D body "SOT23-5-ym5-tr.stp": height 46.46, standoff 0.2, extent -58.81,-55 58.81,55.24

## SOT23-6 [mil] "SOT23-6"
pads (6):
  rect 24x44 smd: 1(-37.4,-52) 2(0,-52) 3(37.4,-52) 4(37.4,52) 5(0,52) 6(-37.4,52)
Top Overlay:
  lines w6: -67.01,-10 -67.01,-41.46 -56.42,-41.46 ; -67.01,10 -67.01,41.46 -56.42,41.46 ; -66.97,-10.04 ccw(c-66.97,-0.04) -66.97,9.96 ; 56.42,-41.46 67.01,-41.46 67.01,41.46 56.42,41.46
  text "1" at -66.69,-79.38 h15
Top Courtyard:
  region: -59.41,-84.02 -59.41,-44.45 -70,-44.45 -70,44.45 -59.41,44.45 -59.41,84.02 59.41,84.02 59.41,44.45 70,44.45 70,-44.45 59.41,-44.45 59.41,-84.02
Top Assembly:
  lines w1: -59.98,-10 -59.98,-34.45 59.98,-34.45 59.98,34.45 -59.98,34.45 -59.98,10
Top Value:
  text ".Comment" at -51.17,-7.5 h15
Top Component Center:
  lines w1: -10,0 10,0 ; 0,-10 0,10
Top Designator:
  text ".Designator" at -54.7,-5.36 h15
Top Component Outline:
  region: -60,-34.45 -60,34.45 -49.41,34.45 -49.41,74.02 49.41,74.02 49.41,34.45 60,34.45 60,-34.45 49.41,-34.45 49.41,-74.02 -49.41,-74.02 -49.41,-34.45
  region: -60,34.45 -49.41,34.45 -49.41,74.02 49.41,74.02 49.41,34.45 60,34.45 60,-34.45 49.41,-34.45 49.41,-37.44 49.41,-45.75 49.41,-74.02 49.33,-74.02 -49.37,-74.02 -49.41,-74.02 -49.41,-73.98 -49.41,-34.45 -60,-34.45
3D body "SOT23-6.step": height 51.18, standoff 0, extent -59.06,-59.06 59.06,59.06

## TESTPOINT_35MIL [mil] "TESTPOINT_35MIL"
pads (1):
  round 35 smd paste-99999: 1(0,0)
Top Courtyard:
  region: 27.23,0 26.31,7.05 23.58,13.62 19.26,19.26 13.62,23.58 7.05,26.31 0,27.23 -7.05,26.31 -13.62,23.58 -19.26,19.26 -23.58,13.62 -26.31,7.05 -27.23,0 -26.31,-7.05 -23.58,-13.62 -19.26,-19.26 -13.62,-23.58 -7.05,-26.31 0,-27.23 7.05,-26.31 13.62,-23.58 19.26,-19.26 23.58,-13.62 26.31,-7.05
Top Value:
  text ".Comment" at -51.17,-7.5 h15
Top Designator:
  text ".Designator" at -54.7,-5.36 h15
Top Component Outline:
  region: 17.84,0 16.48,6.83 12.62,12.62 6.83,16.48 0,17.84 -6.83,16.48 -8.77,15.19 -12.62,12.62 -16.48,6.83 -17.84,0 -16.48,-6.83 -12.62,-12.62 -8.77,-15.19 -6.83,-16.48 0,-17.84 6.83,-16.48 12.62,-12.62 16.48,-6.83
  region: 17.84,0 16.48,6.83 12.62,12.62 6.83,16.48 0,17.84 -6.83,16.48 -8.77,15.19 -12.62,12.62 -16.48,6.83 -17.84,0 -16.48,-6.83 -12.62,-12.62 -8.77,-15.19 -6.83,-16.48 0,-17.84 6.83,-16.48 12.62,-12.62 16.48,-6.83
3D body: height 150, standoff 0, extent -17.84,-17.84 17.84,17.84